# Altium footprint library Connectors Pad Lib.PcbLib: 211 footprints (part 4 of 14)
Each footprint in its own frame and in the unit in brackets; x right, y up, seen from the top. Pads: shape width x height; smd on the part's side, far side on the other; paste and mask are expansions set on the pad; w line width, h text height; cw(c..) or ccw(c..) is an arc to the next point about the centre after c.
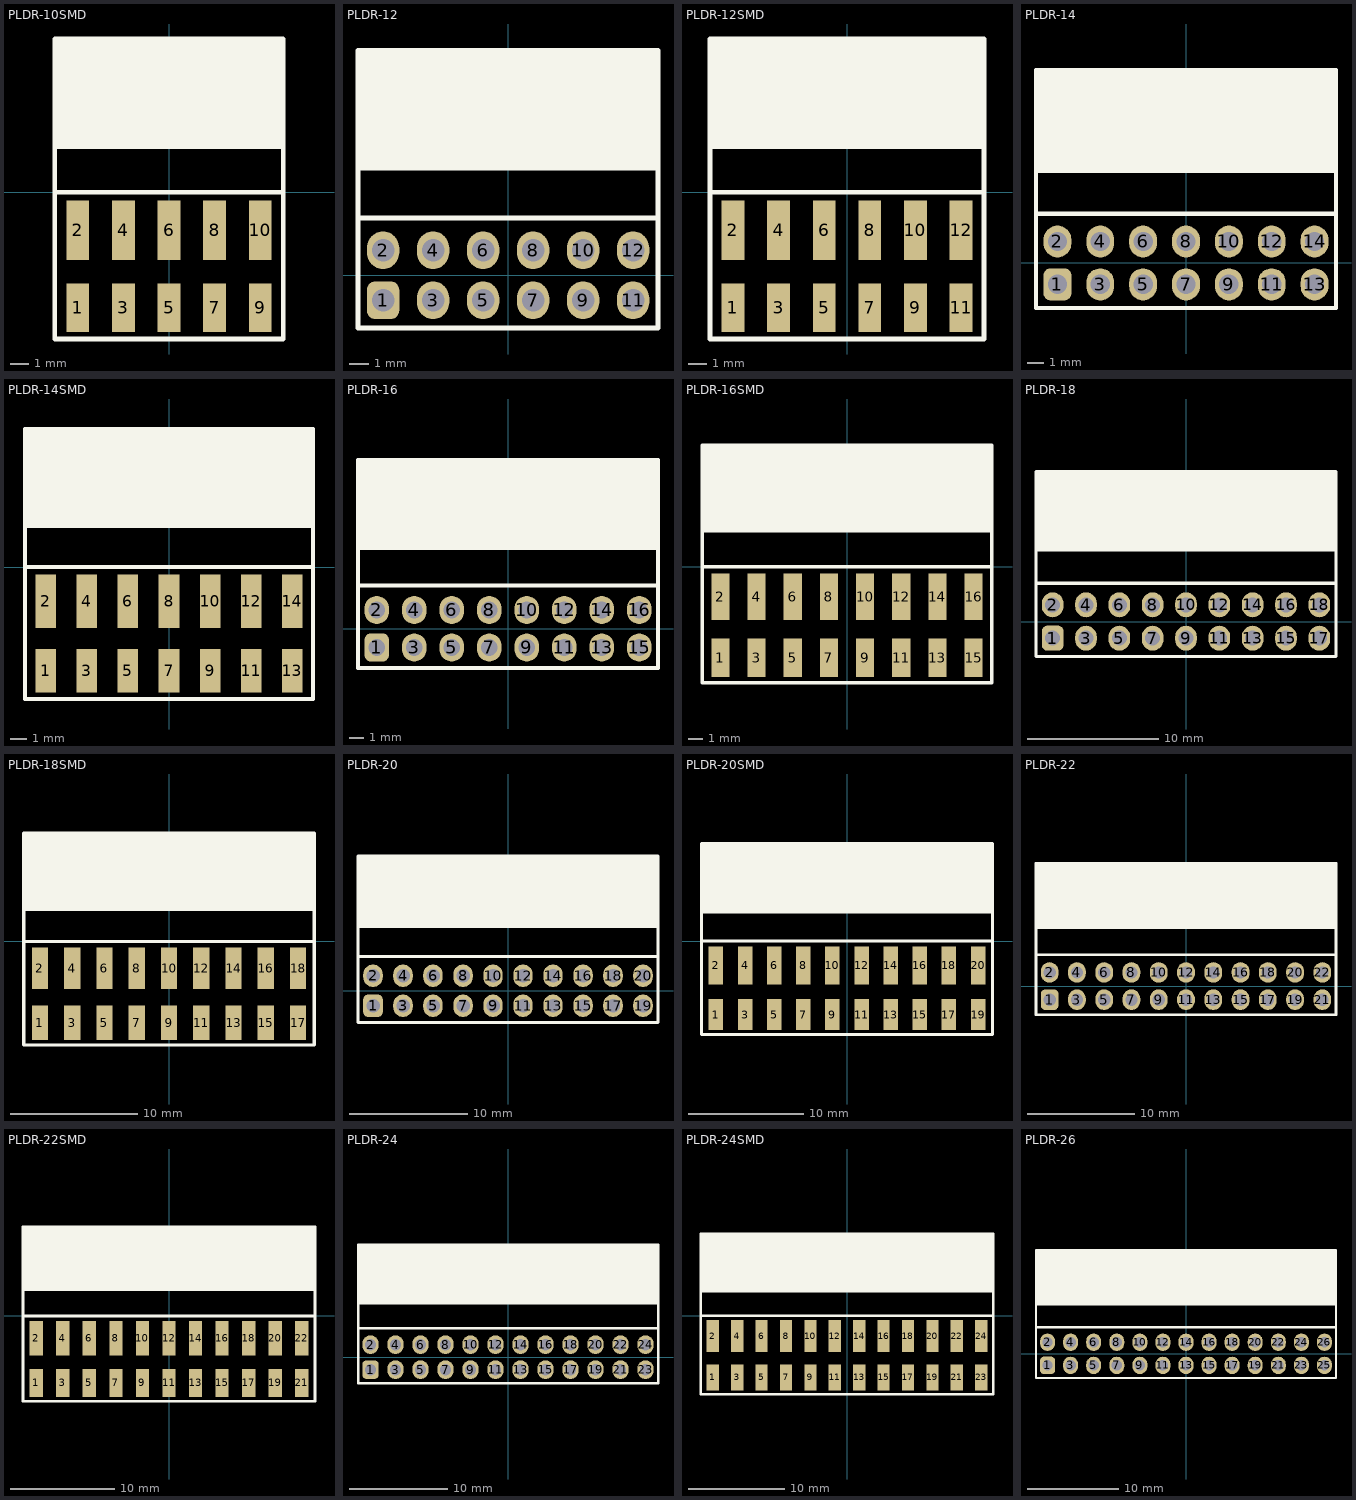
[diagram p3: the footprints below, top view; thin cyan lines are the x and y axes]

## PLDR-10SMD [mm] "PCB Right Angled Dual Connector SMD 10-Pin"
height 5.004
pads (10):
  rect 1.27x2.7 smd: 1(-5.08,-6.41) 3(-2.54,-6.41) 5(0,-6.41) 7(2.54,-6.41) 9(5.08,-6.41)
  rect 1.27x3.3 smd: 2(-5.08,-2.11) 4(-2.54,-2.11) 6(0,-2.11) 8(2.54,-2.11) 10(5.08,-2.11)
Top Overlay:
  rectangle: -6.35,2.54 6.35,8.534
  lines w0.254: -6.35,0 6.35,0 ; -6.35,2.54 6.35,2.54 ; -6.35,-8.153 6.35,-8.153 6.35,8.534 -6.35,8.534 -6.35,-8.153
3D body "PLDR_SMD-10.STEP": height 5.04, standoff 0.04, extent -6.35,-7.3 6.35,8.54

## PLDR-12 [mil] "PCB Right Angled Dual Connector 12-Pin"
height 197
pads (12):
  rrect50% 65x75 hole 45: 1(-250,-50)
  oval 65x75 hole 45: 2(-250,50) 3(-150,-50) 4(-150,50) 5(-50,-50) 6(-50,50) 7(50,-50) 8(50,50) 9(150,-50) 10(150,50) 11(250,-50) 12(250,50)
Top Overlay:
  rectangle: -300,215 300,450
  lines w10: -300,115 300,115 ; -300,215 300,215 ; -300,-105 -300,450 300,450 300,-105 -300,-105
3D body "PLDR-12.STEP": height 198.43, standoff -116.54, extent -300,-62.6 300,450.79

## PLDR-12SMD [mm] "PCB Right Angled Dual Connector SMD 12-Pin"
height 5.004
pads (12):
  rect 1.27x2.7 smd: 1(-6.35,-6.41) 3(-3.81,-6.41) 5(-1.27,-6.41) 7(1.27,-6.41) 9(3.81,-6.41) 11(6.35,-6.41)
  rect 1.27x3.3 smd: 2(-6.35,-2.11) 4(-3.81,-2.11) 6(-1.27,-2.11) 8(1.27,-2.11) 10(3.81,-2.11) 12(6.35,-2.11)
Top Overlay:
  rectangle: -7.62,2.54 7.62,8.534
  lines w0.254: -7.62,0 7.62,0 ; -7.62,2.54 7.62,2.54 ; -7.62,-8.153 7.62,-8.153 7.62,8.534 -7.62,8.534 -7.62,-8.153
3D body "PLDR_SMD-12.STEP": height 5.04, standoff 0.04, extent -7.62,-7.3 7.62,8.54

## PLDR-14 [mil] "PCB Right Angled Dual Connector 14-Pin"
height 197
pads (14):
  rrect50% 65x75 hole 45: 1(-300,-50)
  oval 65x75 hole 45: 2(-300,50) 3(-200,-50) 4(-200,50) 5(-100,-50) 6(-100,50) 7(0,-50) 8(0,50) 9(100,-50) 10(100,50) 11(200,-50) 12(200,50) 13(300,-50) 14(300,50)
Top Overlay:
  rectangle: -350,215 350,450
  lines w10: -350,115 350,115 ; -350,215 350,215 ; -350,-105 -350,450 350,450 350,-105 -350,-105
3D body "PLDR-14.STEP": height 198.43, standoff -116.54, extent -350,-62.6 350,450.79

## PLDR-14SMD [mm] "PCB Right Angled Dual Connector SMD 14-Pin"
height 5.004
pads (14):
  rect 1.27x2.7 smd: 1(-7.62,-6.41) 3(-5.08,-6.41) 5(-2.54,-6.41) 7(0,-6.41) 9(2.54,-6.41) 11(5.08,-6.41) 13(7.62,-6.41)
  rect 1.27x3.3 smd: 2(-7.62,-2.11) 4(-5.08,-2.11) 6(-2.54,-2.11) 8(0,-2.11) 10(2.54,-2.11) 12(5.08,-2.11) 14(7.62,-2.11)
Top Overlay:
  rectangle: -8.89,2.54 8.89,8.534
  lines w0.254: -8.89,0 8.89,0 ; -8.89,2.54 8.89,2.54 ; -8.89,-8.153 8.89,-8.153 8.89,8.534 -8.89,8.534 -8.89,-8.153
3D body "PLDR_SMD-14.STEP": height 5.04, standoff 0.04, extent -8.89,-7.3 8.89,8.54

## PLDR-16 [mil] "PCB Right Angled Dual Connector 16-Pin"
height 197
pads (16):
  rrect50% 65x75 hole 45: 1(-350,-50)
  oval 65x75 hole 45: 2(-350,50) 3(-250,-50) 4(-250,50) 5(-150,-50) 6(-150,50) 7(-50,-50) 8(-50,50) 9(50,-50) 10(50,50) 11(150,-50) 12(150,50) 13(250,-50) 14(250,50) 15(350,-50) 16(350,50)
Top Overlay:
  rectangle: -400,215 400,450
  lines w10: -400,115 400,115 ; -400,215 400,215 ; -400,-105 -400,450 400,450 400,-105 -400,-105
3D body "PLDR-16.STEP": height 198.43, standoff -116.54, extent -400,-62.6 400,450.79

## PLDR-16SMD [mm] "PCB Right Angled Dual Connector SMD 16-Pin"
height 5.004
pads (16):
  rect 1.27x2.7 smd: 1(-8.89,-6.41) 3(-6.35,-6.41) 5(-3.81,-6.41) 7(-1.27,-6.41) 9(1.27,-6.41) 11(3.81,-6.41) 13(6.35,-6.41) 15(8.89,-6.41)
  rect 1.27x3.3 smd: 2(-8.89,-2.11) 4(-6.35,-2.11) 6(-3.81,-2.11) 8(-1.27,-2.11) 10(1.27,-2.11) 12(3.81,-2.11) 14(6.35,-2.11) 16(8.89,-2.11)
Top Overlay:
  rectangle: -10.16,2.54 10.16,8.534
  lines w0.254: -10.16,0 10.16,0 ; -10.16,2.54 10.16,2.54 ; -10.16,-8.153 10.16,-8.153 10.16,8.534 -10.16,8.534 -10.16,-8.153
3D body "PLDR_SMD-16.STEP": height 5.04, standoff 0.04, extent -10.16,-7.3 10.16,8.54

## PLDR-18 [mil] "PCB Right Angled Dual Connector 18-Pin"
height 197
pads (18):
  rrect50% 65x75 hole 45: 1(-400,-50)
  oval 65x75 hole 45: 2(-400,50) 3(-300,-50) 4(-300,50) 5(-200,-50) 6(-200,50) 7(-100,-50) 8(-100,50) 9(0,-50) 10(0,50) 11(100,-50) 12(100,50) 13(200,-50) 14(200,50) 15(300,-50) 16(300,50) 17(400,-50) 18(400,50)
Top Overlay:
  rectangle: -450,215 450,450
  lines w10: -450,115 450,115 ; -450,215 450,215 ; -450,-105 450,-105 450,450 -450,450 -450,-105
3D body "PLDR-18.STEP": height 198.43, standoff -116.54, extent -450,-62.6 450,450.79

## PLDR-18SMD [mm] "PCB Right Angled Dual Connector SMD 18-Pin"
height 5.004
pads (18):
  rect 1.27x2.7 smd: 1(-10.16,-6.41) 3(-7.62,-6.41) 5(-5.08,-6.41) 7(-2.54,-6.41) 9(0,-6.41) 11(2.54,-6.41) 13(5.08,-6.41) 15(7.62,-6.41) 17(10.16,-6.41)
  rect 1.27x3.3 smd: 2(-10.16,-2.11) 4(-7.62,-2.11) 6(-5.08,-2.11) 8(-2.54,-2.11) 10(0,-2.11) 12(2.54,-2.11) 14(5.08,-2.11) 16(7.62,-2.11) 18(10.16,-2.11)
Top Overlay:
  rectangle: -11.43,2.54 11.43,8.534
  lines w0.254: -11.43,0 11.43,0 ; -11.43,2.54 11.43,2.54 ; -11.43,-8.153 -11.43,8.534 11.43,8.534 11.43,-8.153 -11.43,-8.153
3D body "PLDR_SMD-18.STEP": height 5.04, standoff 0.04, extent -11.43,-7.3 11.43,8.54

## PLDR-20 [mil] "PCB Right Angled Dual Connector 20-Pin"
height 197
pads (20):
  rrect50% 65x75 hole 45: 1(-450,-50)
  oval 65x75 hole 45: 2(-450,50) 3(-350,-50) 4(-350,50) 5(-250,-50) 6(-250,50) 7(-150,-50) 8(-150,50) 9(-50,-50) 10(-50,50) 11(50,-50) 12(50,50) 13(150,-50) 14(150,50) 15(250,-50) 16(250,50) 17(350,-50) 18(350,50) 19(450,-50) 20(450,50)
Top Overlay:
  rectangle: -500,215 500,450
  lines w10: -500,115 500,115 ; -500,215 500,215 ; -500,-105 500,-105 500,450 -500,450 -500,-105
3D body "PLDR-20.STEP": height 198.43, standoff -116.54, extent -500,-62.6 500,450.79

## PLDR-20SMD [mm] "PCB Right Angled Dual Connector SMD 20-Pin"
height 5.004
pads (20):
  rect 1.27x2.7 smd: 1(-11.43,-6.41) 3(-8.89,-6.41) 5(-6.35,-6.41) 7(-3.81,-6.41) 9(-1.27,-6.41) 11(1.27,-6.41) 13(3.81,-6.41) 15(6.35,-6.41) 17(8.89,-6.41) 19(11.43,-6.41)
  rect 1.27x3.3 smd: 2(-11.43,-2.11) 4(-8.89,-2.11) 6(-6.35,-2.11) 8(-3.81,-2.11) 10(-1.27,-2.11) 12(1.27,-2.11) 14(3.81,-2.11) 16(6.35,-2.11) 18(8.89,-2.11) 20(11.43,-2.11)
Top Overlay:
  rectangle: -12.7,2.54 12.7,8.534
  lines w0.254: -12.7,0 12.7,0 ; -12.7,2.54 12.7,2.54 ; -12.7,-8.153 12.7,-8.153 12.7,8.534 -12.7,8.534 -12.7,-8.153
3D body "PLDR_SMD-20.STEP": height 5.04, standoff 0.04, extent -12.7,-7.3 12.7,8.54

## PLDR-22 [mil] "PCB Right Angled Dual Connector 22-Pin"
height 197
pads (22):
  rrect50% 65x75 hole 45: 1(-500,-50)
  oval 65x75 hole 45: 2(-500,50) 3(-400,-50) 4(-400,50) 5(-300,-50) 6(-300,50) 7(-200,-50) 8(-200,50) 9(-100,-50) 10(-100,50) 11(0,-50) 12(0,50) 13(100,-50) 14(100,50) 15(200,-50) 16(200,50) 17(300,-50) 18(300,50) 19(400,-50) 20(400,50) 21(500,-50) 22(500,50)
Top Overlay:
  rectangle: -550,215 550,450
  lines w10: -550,115 550,115 ; -550,215 550,215 ; -550,-105 -550,450 550,450 550,-105 -550,-105
3D body "PLDR-22.STEP": height 198.43, standoff -116.54, extent -550,-62.6 550,450.79

## PLDR-22SMD [mm] "PCB Right Angled Dual Connector SMD 22-Pin"
height 5.004
pads (22):
  rect 1.27x2.7 smd: 1(-12.7,-6.41) 3(-10.16,-6.41) 5(-7.62,-6.41) 7(-5.08,-6.41) 9(-2.54,-6.41) 11(0,-6.41) 13(2.54,-6.41) 15(5.08,-6.41) 17(7.62,-6.41) 19(10.16,-6.41) 21(12.7,-6.41)
  rect 1.27x3.3 smd: 2(-12.7,-2.11) 4(-10.16,-2.11) 6(-7.62,-2.11) 8(-5.08,-2.11) 10(-2.54,-2.11) 12(0,-2.11) 14(2.54,-2.11) 16(5.08,-2.11) 18(7.62,-2.11) 20(10.16,-2.11) 22(12.7,-2.11)
Top Overlay:
  rectangle: -13.97,2.54 13.97,8.534
  lines w0.254: -13.97,0 13.97,0 ; -13.97,2.54 13.97,2.54 ; -13.97,-8.153 13.97,-8.153 13.97,8.534 -13.97,8.534 -13.97,-8.153
3D body "PLDR_SMD-22.STEP": height 5.04, standoff 0.04, extent -13.97,-7.3 13.97,8.54

## PLDR-24 [mil] "PCB Right Angled Dual Connector 24-Pin"
height 197
pads (24):
  rrect50% 65x75 hole 45: 1(-550,-50)
  oval 65x75 hole 45: 2(-550,50) 3(-450,-50) 4(-450,50) 5(-350,-50) 6(-350,50) 7(-250,-50) 8(-250,50) 9(-150,-50) 10(-150,50) 11(-50,-50) 12(-50,50) 13(50,-50) 14(50,50) 15(150,-50) 16(150,50) 17(250,-50) 18(250,50) 19(350,-50) 20(350,50) 21(450,-50) 22(450,50) 23(550,-50) 24(550,50)
Top Overlay:
  rectangle: -600,215 600,450
  lines w10: -600,115 600,115 ; -600,215 600,215 ; -600,-105 -600,450 600,450 600,-105 -600,-105
3D body "PLDR-24.STEP": height 198.43, standoff -116.54, extent -600,-62.6 600,450.79

## PLDR-24SMD [mm] "PCB Right Angled Dual Connector SMD 24-Pin"
height 5.004
pads (24):
  rect 1.27x2.7 smd: 1(-13.97,-6.41) 3(-11.43,-6.41) 5(-8.89,-6.41) 7(-6.35,-6.41) 9(-3.81,-6.41) 11(-1.27,-6.41) 13(1.27,-6.41) 15(3.81,-6.41) 17(6.35,-6.41) 19(8.89,-6.41) 21(11.43,-6.41) 23(13.97,-6.41)
  rect 1.27x3.3 smd: 2(-13.97,-2.11) 4(-11.43,-2.11) 6(-8.89,-2.11) 8(-6.35,-2.11) 10(-3.81,-2.11) 12(-1.27,-2.11) 14(1.27,-2.11) 16(3.81,-2.11) 18(6.35,-2.11) 20(8.89,-2.11) 22(11.43,-2.11) 24(13.97,-2.11)
Top Overlay:
  rectangle: -15.24,2.54 15.24,8.534
  lines w0.254: -15.24,0 15.24,0 ; -15.24,2.54 15.24,2.54 ; -15.24,-8.153 15.24,-8.153 15.24,8.534 -15.24,8.534 -15.24,-8.153
3D body "PLDR_SMD-24.STEP": height 5.04, standoff 0.04, extent -15.24,-7.3 15.24,8.54

## PLDR-26 [mil] "PCB Right Angled Dual Connector 26-Pin"
height 197
pads (26):
  rrect50% 65x75 hole 45: 1(-600,-50)
  oval 65x75 hole 45: 2(-600,50) 3(-500,-50) 4(-500,50) 5(-400,-50) 6(-400,50) 7(-300,-50) 8(-300,50) 9(-200,-50) 10(-200,50) 11(-100,-50) 12(-100,50) 13(0,-50) 14(0,50) 15(100,-50) 16(100,50) 17(200,-50) 18(200,50) 19(300,-50) 20(300,50) 21(400,-50) 22(400,50) 23(500,-50) 24(500,50) 25(600,-50) 26(600,50)
Top Overlay:
  rectangle: -650,215 650,450
  lines w10: -650,115 650,115 ; -650,215 650,215 ; -650,-105 -650,450 650,450 650,-105 -650,-105
3D body "PLDR-26.STEP": height 198.43, standoff -116.54, extent -650,-62.6 650,450.79